# Altium footprint library MOLEX SMD.PcbLib: 54 footprints (part 2 of 4) (continued)
## MOLEX_55909-0274 [mm] "0.40mm Pitch SlimStack Dual Row 20 Circuits Surface Mount Vertical Plug" (continued)
Mechanical 14:
  drawing of 173 lines, arcs and shapes, not listed
Mechanical 15:
  lines w0.05: -3.25,-1.415 -2.16,-1.415 -2.16,-2.015 0,-2.015 2.16,-2.015 2.16,-1.415 3.25,-1.415 3.25,1.415 2.16,1.415 2.16,2.015 0,2.015 -2.16,2.015 -2.16,1.415 -3.25,1.415 -3.25,-1.415
3D body "MOLEX_55909-0274.stp": height 1.14, standoff 0, extent -3,-1.565 3,1.565

## MOLEX_55909-0474 [mm] "0.40mm Pitch SlimStack Dual Row 40 Circuits Surface Mount Vertical Plug"
height 1.14
pads (44):
  rect 0.22x0.9 smd: 1(-3.8,-1.315) 2(-3.8,1.315) 3(-3.4,-1.315) 4(-3.4,1.315) 5(-3,-1.315) 6(-3,1.315) 7(-2.6,-1.315) 8(-2.6,1.315) 9(-2.2,-1.315) 10(-2.2,1.315) 11(-1.8,-1.315) 12(-1.8,1.315) 13(-1.4,-1.315) 14(-1.4,1.315) 15(-1,-1.315) 16(-1,1.315) 17(-0.6,-1.315) 18(-0.6,1.315) 19(-0.2,-1.315) 20(-0.2,1.315) 21(0.2,-1.315) 22(0.2,1.315) 23(0.6,-1.315) 24(0.6,1.315) 25(1,-1.315) 26(1,1.315) 27(1.4,-1.315) 28(1.4,1.315) 29(1.8,-1.315) 30(1.8,1.315) 31(2.2,-1.315) 32(2.2,1.315) 33(2.6,-1.315) 34(2.6,1.315) 35(3,-1.315) 36(3,1.315) 37(3.4,-1.315) 38(3.4,1.315) 39(3.8,-1.315) 40(3.8,1.315)
  rect 0.5x0.85 smd: MECH(-4.6,-0.74) MECH(-4.6,0.74) MECH(4.6,-0.74) MECH(4.6,0.74)
Top Overlay:
  circle w0.25: c-3.75,-2.25 r0.125
  lines w0.2: -4.05,-0.565 4.05,-0.565 ; -4.05,0.565 4.05,0.565
Mechanical 8:
  drawing of 268 lines, arcs and shapes, not listed
Mechanical 14:
  drawing of 333 lines, arcs and shapes, not listed
Mechanical 15:
  lines w0.05: -5.25,-1.415 -4.16,-1.415 -4.16,-2.015 4.16,-2.015 4.16,-1.415 5.25,-1.415 5.25,1.415 4.16,1.415 4.16,2.015 -4.16,2.015 -4.16,1.415 -5.25,1.415 -5.25,-1.415
3D body "MOLEX_55909-0474.stp": height 1.14, standoff 0, extent -5,-1.565 5,1.565

## MOLEX_67800-5005 [mm] "1.27mm Pitch, 7 Contacts, Serial ATA High Speed Header, Straight with Locking Latch"
height 8.4
pads (9):
  rect 0.9x2.4 smd: 1(-3.81,0) 2(-2.54,0) 3(-1.27,0) 4(0,0) 5(1.27,0) 6(2.54,0) 7(3.81,0)
  round 2.1 hole 1.4: MECH1(-6.27,1.1) MECH2(6.56,0.1)
Top Overlay:
  circle w0.25: c-3.75,-2.75 r0.125
  lines w0.2: -7.495,1.778 -7.495,2.225 cw(c-7.045,2.225) -7.045,2.675 -6.635,2.675 -6.635,3.575 7.805,3.575 7.805,0.74 ; -6.495,-0.282 -6.495,-0.775 -5.655,-0.775 -5.655,-1.475 -4.61,-1.475 ; -4.645,0.275 -4.645,1.505 ; -4.11,1.55 -4.11,2.375 -3.51,2.375 -3.51,1.55 ; -2.85,1.55 -2.85,2.375 -2.25,2.375 -2.25,1.55 ; -1.58,1.55 -1.58,2.375 -0.98,2.375 -0.98,1.55 ; -0.31,1.55 -0.31,2.375 0.29,2.375 0.29,1.55 ; 0.96,1.55 0.96,2.375 1.56,2.375 1.56,1.55 ; 2.23,1.55 2.23,2.375 2.83,2.375 2.83,1.55 ; 3.5,1.55 3.5,2.375 4.1,2.375 4.1,1.55 ; 4.61,-1.475 5.605,-1.475 5.605,-0.924 ; 4.61,0.275 5.171,0.275 ; 4.615,1.505 4.615,2.525 5.765,2.525 5.765,1.252 ; -8.285,-0.625 -7.075,-0.625 -7.075,-1.375 -6.295,-1.375 -6.295,-2.125 6.235,-2.125 6.235,-1.325 8.615,-1.325 8.615,4.325 -7.095,4.325 -7.095,3.375 -8.285,3.375 -8.285,-0.625
Mechanical 8:
  circle w0.05: c-6.27,1.1 r0.7
  circle w0.05: c6.56,0.1 r0.7
  lines w0.05: -6.77,1.1 -6.27,1.1 ; -6.27,0.6 -6.27,1.1 ; -6.27,1.6 -6.27,1.1 ; -5.77,1.1 -6.27,1.1 ; -4.31,0 -3.81,0 ; -3.81,-0.5 -3.81,0 ; -3.81,0.5 -3.81,0 ; -3.31,0 -3.81,0 ; -3.04,0 -2.54,0 ; -2.54,-0.5 -2.54,0 ; -2.54,0.5 -2.54,0 ; -2.04,0 -2.54,0 ; -1.77,0 -1.27,0 ; -1.27,-0.5 -1.27,0 ; -1.27,0.5 -1.27,0 ; -0.77,0 -1.27,0 ; -0.5,0 0,0 ; 0,-0.5 0,0 ; 0,0.5 0,0 ; 0.5,0 0,0 ; 0.77,0 1.27,0 ; 1.27,-0.5 1.27,0 ; 1.27,0.5 1.27,0 ; 1.77,0 1.27,0 ; 2.04,0 2.54,0 ; 2.54,-0.5 2.54,0 ; 2.54,0.5 2.54,0 ; 3.04,0 2.54,0 ; 3.31,0 3.81,0 ; 3.81,-0.5 3.81,0 ; 3.81,0.5 3.81,0 ; 4.31,0 3.81,0 ; 6.06,0.1 6.56,0.1 ; 6.56,-0.4 6.56,0.1 ; 6.56,0.6 6.56,0.1 ; 7.06,0.1 6.56,0.1 ; -4.26,-1.2 -4.26,1.2 -3.36,1.2 -3.36,-1.2 -4.26,-1.2 ; -2.99,-1.2 -2.99,1.2 -2.09,1.2 -2.09,-1.2 -2.99,-1.2 ; -1.72,-1.2 -1.72,1.2 -0.82,1.2 -0.82,-1.2 -1.72,-1.2 ; -0.45,-1.2 -0.45,1.2 0.45,1.2 0.45,-1.2 -0.45,-1.2 ; 0.82,-1.2 0.82,1.2 1.72,1.2 1.72,-1.2 0.82,-1.2 ; 2.09,-1.2 2.09,1.2 2.99,1.2 2.99,-1.2 2.09,-1.2 ; 3.36,-1.2 3.36,1.2 4.26,1.2 4.26,-1.2 3.36,-1.2
Mechanical 14:
  circle w0.1: c6.545,0.1 r0.55
  circle w0.1: c-6.285,1.1 r0.55
  lines w0.1: -4.11,1.505 -4.11,2.375 -3.51,2.375 -3.51,1.505 ; -2.85,1.505 -2.85,2.375 -2.25,2.375 -2.25,1.505 ; -1.58,1.505 -1.58,2.375 -0.98,2.375 -0.98,1.505 ; -1.315,0.275 -1.315,-0.625 1.005,-0.625 1.005,0.275 ; -0.31,1.505 -0.31,2.375 0.29,2.375 0.29,1.505 ; 0.96,1.505 0.96,2.375 1.56,2.375 1.56,1.505 ; 2.23,1.505 2.23,2.375 2.83,2.375 2.83,1.505 ; 3.5,1.505 3.5,2.375 4.1,2.375 4.1,1.505 ; -8.285,-0.625 -7.075,-0.625 -7.075,-1.375 -6.295,-1.375 -6.295,-2.125 6.235,-2.125 6.235,-1.325 8.615,-1.325 8.615,4.325 -7.095,4.325 -7.095,3.375 -8.285,3.375 -8.285,-0.625 ; -7.495,0.525 ccw(c-7.045,0.525) -7.045,0.075 -6.495,0.075 -6.495,-0.775 -5.655,-0.775 -5.655,-1.475 5.605,-1.475 5.605,-0.775 7.805,-0.775 7.805,3.575 -6.635,3.575 -6.635,2.675 -7.045,2.675 ccw(c-7.045,2.225) -7.495,2.225 -7.495,0.525 ; -4.645,0.275 -4.645,1.505 4.615,1.505 4.615,2.525 5.765,2.525 5.765,0.275 -4.645,0.275
3D body "MOLEX_67800-5005.stp": height 8.4, standoff -2.65, extent -8.285,-2.125 8.615,4.325

## MOLEX_71436-1164 [mm] "1mm Centerline, FH (IEEE 1386) Surface Mount, Stacking Board-to-Board Male Connectors"
height 7.48
pads (66):
  rect 0.6x2.7 smd: 1(-15.5,1.65) 2(-15.5,-1.65) 3(-14.5,1.65) 4(-14.5,-1.65) 5(-13.5,1.65) 6(-13.5,-1.65) 7(-12.5,1.65) 8(-12.5,-1.65) 9(-11.5,1.65) 10(-11.5,-1.65) 11(-10.5,1.65) 12(-10.5,-1.65) 13(-9.5,1.65) 14(-9.5,-1.65) 15(-8.5,1.65) 16(-8.5,-1.65) 17(-7.5,1.65) 18(-7.5,-1.65) 19(-6.5,1.65) 20(-6.5,-1.65) 21(-5.5,1.65) 22(-5.5,-1.65) 23(-4.5,1.65) 24(-4.5,-1.65) 25(-3.5,1.65) 26(-3.5,-1.65) 27(-2.5,1.65) 28(-2.5,-1.65) 29(-1.5,1.65) 30(-1.5,-1.65) 31(-0.5,1.65) 32(-0.5,-1.65) 33(0.5,1.65) 34(0.5,-1.65) 35(1.5,1.65) 36(1.5,-1.65) 37(2.5,1.65) 38(2.5,-1.65) 39(3.5,1.65) 40(3.5,-1.65) 41(4.5,1.65) 42(4.5,-1.65) 43(5.5,1.65) 44(5.5,-1.65) 45(6.5,1.65) 46(6.5,-1.65) 47(7.5,1.65) 48(7.5,-1.65) 49(8.5,1.65) 50(8.5,-1.65) 51(9.5,1.65) 52(9.5,-1.65) 53(10.5,1.65) 54(10.5,-1.65) 55(11.5,1.65) 56(11.5,-1.65) 57(12.5,1.65) 58(12.5,-1.65) 59(13.5,1.65) 60(13.5,-1.65) 61(14.5,1.65) 62(14.5,-1.65) 63(15.5,1.65) 64(15.5,-1.65)
  round 0.5 hole 1.5 unplated mask+0.5: 65(-17.2,0) 66(17.2,0)
Top Overlay:
  circle w0.25: c-15.5,3.6 r0.125
  lines w0.2: -17.95,-1.275 ccw(c-16.95,-1.275) -16.95,-2.275 ; -17.95,-1 -17.95,-3.025 -16.95,-3.025 -16.95,-2.275 ; -17.95,1 -17.95,3.025 -16.95,3.025 -16.95,2.275 ; -17.95,1.275 cw(c-16.95,1.275) -16.95,2.275 ; -17.29,-1 -17.29,-1.2 ccw(c-16.84,-1.2) -16.84,-1.65 -16.3,-1.65 -16.3,-2 -16,-2 ; -17.29,1 -17.29,1.2 cw(c-16.84,1.2) -16.84,1.65 -16.3,1.65 -16.3,2 -16,2 ; -16.15,-0.5 -16.15,0.5 ; -16.15,0 16.15,0 ; -16,-2.575 -16.75,-2.575 -16.75,-2.275 -16.95,-2.275 ; -16,2.575 -16.75,2.575 -16.75,2.275 -16.95,2.275 ; 16,-2.575 16.75,-2.575 16.75,-2.275 16.95,-2.275 ; 16,-2 16.3,-2 16.3,-1.65 16.84,-1.65 ccw(c16.84,-1.2) 17.29,-1.2 17.29,-1 ; 16,2 16.3,2 16.3,1.65 16.84,1.65 cw(c16.84,1.2) 17.29,1.2 17.29,1 ; 16,2.575 16.75,2.575 16.75,2.275 16.95,2.275 ; 16.15,-0.5 16.15,0.5 ; 17.95,-1.275 cw(c16.95,-1.275) 16.95,-2.275 ; 17.95,-1 17.95,-3.025 16.95,-3.025 16.95,-2.275 ; 17.95,1 17.95,3.025 16.95,3.025 16.95,2.275 ; 17.95,1.275 ccw(c16.95,1.275) 16.95,2.275
Mechanical 14:
  drawing of 251 lines, arcs and shapes, not listed
Mechanical 15:
  lines w0.05: -18.2,-3.275 -18.2,3.275 18.2,3.275 18.2,-3.275 -18.2,-3.275
3D body "MOLEX_71436-1164.stp": height 7.35, standoff -0.75, extent -17.95,-3.025 17.95,3.075

## MOLEX_71436-2164 [mm] "1mm Centerline, FH (IEEE 1386) Surface Mount, Stacking Board-to-Board Male Connectors"
height 8.48
pads (66):
  rect 0.6x2.3 smd: 1(-15.5,1.85) 2(-15.5,-1.85) 3(-14.5,1.85) 4(-14.5,-1.85) 5(-13.5,1.85) 6(-13.5,-1.85) 7(-12.5,1.85) 8(-12.5,-1.85) 9(-11.5,1.85) 10(-11.5,-1.85) 11(-10.5,1.85) 12(-10.5,-1.85) 13(-9.5,1.85) 14(-9.5,-1.85) 15(-8.5,1.85) 16(-8.5,-1.85) 17(-7.5,1.85) 18(-7.5,-1.85) 19(-6.5,1.85) 20(-6.5,-1.85) 21(-5.5,1.85) 22(-5.5,-1.85) 23(-4.5,1.85) 24(-4.5,-1.85) 25(-3.5,1.85) 26(-3.5,-1.85) 27(-2.5,1.85) 28(-2.5,-1.85) 29(-1.5,1.85) 30(-1.5,-1.85) 31(-0.5,1.85) 32(-0.5,-1.85) 33(0.5,1.85) 34(0.5,-1.85) 35(1.5,1.85) 36(1.5,-1.85) 37(2.5,1.85) 38(2.5,-1.85) 39(3.5,1.85) 40(3.5,-1.85) 41(4.5,1.85) 42(4.5,-1.85) 43(5.5,1.85) 44(5.5,-1.85) 45(6.5,1.85) 46(6.5,-1.85) 47(7.5,1.85) 48(7.5,-1.85) 49(8.5,1.85) 50(8.5,-1.85) 51(9.5,1.85) 52(9.5,-1.85) 53(10.5,1.85) 54(10.5,-1.85) 55(11.5,1.85) 56(11.5,-1.85) 57(12.5,1.85) 58(12.5,-1.85) 59(13.5,1.85) 60(13.5,-1.85) 61(14.5,1.85) 62(14.5,-1.85) 63(15.5,1.85) 64(15.5,-1.85)
  round 0.5 hole 1.5 unplated mask+0.5: 65(-17.2,0) 66(17.2,0)
Top Overlay:
  circle w0.25: c-15.5,3.6 r0.125
  lines w0.2: -17.95,-1.275 ccw(c-16.95,-1.275) -16.95,-2.275 ; -17.95,-1 -17.95,-3.025 -16.95,-3.025 -16.95,-2.275 ; -17.95,1 -17.95,3.025 -16.95,3.025 -16.95,2.275 ; -17.95,1.275 cw(c-16.95,1.275) -16.95,2.275 ; -17.29,-1 -17.29,-1.2 ccw(c-16.84,-1.2) -16.84,-1.65 -16.3,-1.65 -16.3,-2 -16,-2 ; -17.29,1 -17.29,1.2 cw(c-16.84,1.2) -16.84,1.65 -16.3,1.65 -16.3,2 -16,2 ; -16.15,-0.5 -16.15,0.5 ; -16.15,0 16.15,0 ; -16,-2.575 -16.75,-2.575 -16.75,-2.275 -16.95,-2.275 ; -16,2.575 -16.75,2.575 -16.75,2.275 -16.95,2.275 ; 16,-2.575 16.75,-2.575 16.75,-2.275 16.95,-2.275 ; 16,-2 16.3,-2 16.3,-1.65 16.84,-1.65 ccw(c16.84,-1.2) 17.29,-1.2 17.29,-1 ; 16,2 16.3,2 16.3,1.65 16.84,1.65 cw(c16.84,1.2) 17.29,1.2 17.29,1 ; 16,2.575 16.75,2.575 16.75,2.275 16.95,2.275 ; 16.15,-0.5 16.15,0.5 ; 17.95,-1.275 cw(c16.95,-1.275) 16.95,-2.275 ; 17.95,-1 17.95,-3.025 16.95,-3.025 16.95,-2.275 ; 17.95,1 17.95,3.025 16.95,3.025 16.95,2.275 ; 17.95,1.275 ccw(c16.95,1.275) 16.95,2.275
Mechanical 8:
  drawing of 284 lines, arcs and shapes, not listed
Mechanical 14:
  drawing of 251 lines, arcs and shapes, not listed
Mechanical 15:
  lines w0.05: -18.2,-3.275 18.2,-3.275 18.2,3.275 -18.2,3.275 -18.2,-3.275
3D body "MOLEX_71436-2164.stp": height 8.35, standoff -0.75, extent -17.95,-3.05 17.95,3.05

## MOLEX_71439-2164 [mm] "2x32 Position, 1mm Centerline, Surface Mount, Stacking Board-to-Board Female Connector (IEEE 1386 Mezzanine Connector)"
height 8.48
pads (66):
  rect 0.6x2.1 smd: 1(-15.5,-1.95) 2(-15.5,1.95) 3(-14.5,-1.95) 4(-14.5,1.95) 5(-13.5,-1.95) 6(-13.5,1.95) 7(-12.5,-1.95) 8(-12.5,1.95) 9(-11.5,-1.95) 10(-11.5,1.95) 11(-10.5,-1.95) 12(-10.5,1.95) 13(-9.5,-1.95) 14(-9.5,1.95) 15(-8.5,-1.95) 16(-8.5,1.95) 17(-7.5,-1.95) 18(-7.5,1.95) 19(-6.5,-1.95) 20(-6.5,1.95) 21(-5.5,-1.95) 22(-5.5,1.95) 23(-4.5,-1.95) 24(-4.5,1.95) 25(-3.5,-1.95) 26(-3.5,1.95) 27(-2.5,-1.95) 28(-2.5,1.95) 29(-1.5,-1.95) 30(-1.5,1.95) 31(-0.5,-1.95) 32(-0.5,1.95) 33(0.5,-1.95) 34(0.5,1.95) 35(1.5,-1.95) 36(1.5,1.95) 37(2.5,-1.95) 38(2.5,1.95) 39(3.5,-1.95) 40(3.5,1.95) 41(4.5,-1.95) 42(4.5,1.95) 43(5.5,-1.95) 44(5.5,1.95) 45(6.5,-1.95) 46(6.5,1.95) 47(7.5,-1.95) 48(7.5,1.95) 49(8.5,-1.95) 50(8.5,1.95) 51(9.5,-1.95) 52(9.5,1.95) 53(10.5,-1.95) 54(10.5,1.95) 55(11.5,-1.95) 56(11.5,1.95) 57(12.5,-1.95) 58(12.5,1.95) 59(13.5,-1.95) 60(13.5,1.95) 61(14.5,-1.95) 62(14.5,1.95) 63(15.5,-1.95) 64(15.5,1.95)
  round 0.5 hole 1.5 unplated mask+0.5: 65(-17.2,0) 66(17.2,0)
Top Overlay:
  circle w0.25: c-15.5,-3.6 r0.125
  lines w0.2: -17.95,-0.6 -17.95,-3.025 -16.2,-3.025 -16.2,-1.46 -16.56,-1.46 cw(c-16.56,-0.91) -17.11,-0.91 ; -17.95,0.6 -17.95,3.025 -16.2,3.025 -16.2,1.46 -16.56,1.46 ccw(c-16.56,0.91) -17.11,0.91 ; -16.6,-0.69 -16.1,-0.69 ; -16.6,0.69 -16.1,0.69 ; -16.4,-0.69 -16.4,-0.345 ; -16.4,-0.396 -16.1,-0.396 ; -16.4,0.345 -16.4,0.69 ; -16.4,0.396 -16.1,0.396 ; 16.1,-0.69 16.6,-0.69 ; 16.1,-0.396 16.4,-0.396 ; 16.1,0.396 16.4,0.396 ; 16.1,0.69 16.6,0.69 ; 16.4,-0.69 16.4,-0.345 ; 16.4,0.345 16.4,0.69 ; 17.11,-0.91 cw(c16.56,-0.91) 16.56,-1.46 16.2,-1.46 16.2,-3.025 17.95,-3.025 17.95,-0.6 ; 17.11,0.91 ccw(c16.56,0.91) 16.56,1.46 16.2,1.46 16.2,3.025 17.95,3.025 17.95,0.6
Mechanical 8:
  lines w0.1: -1,0 0,0 0,-1
Mechanical 14:
  drawing of 608 lines, arcs and shapes, not listed
Mechanical 15:
  lines w0.05: -18.2,-3.275 18.2,-3.275 18.2,3.275 -18.2,3.275 -18.2,-3.275
3D body "MOLEX_71439-2164.stp": height 10.31, standoff -0.79, extent -17.95,-3.05 17.95,3.05

## MOLEX_71439-3164 [mm] "2x32 Position, 1mm Centerline, Surface Mount, Stacking Board-to-Board Female Connector (IEEE 1386 Mezzanine Connector)"
height 10.48
pads (66):
  rect 0.6x2.4 smd: 1(-15.5,-1.8) 2(-15.5,1.8) 3(-14.5,-1.8) 4(-14.5,1.8) 5(-13.5,-1.8) 6(-13.5,1.8) 7(-12.5,-1.8) 8(-12.5,1.8) 9(-11.5,-1.8) 10(-11.5,1.8) 11(-10.5,-1.8) 12(-10.5,1.8) 13(-9.5,-1.8) 14(-9.5,1.8) 15(-8.5,-1.8) 16(-8.5,1.8) 17(-7.5,-1.8) 18(-7.5,1.8) 19(-6.5,-1.8) 20(-6.5,1.8) 21(-5.5,-1.8) 22(-5.5,1.8) 23(-4.5,-1.8) 24(-4.5,1.8) 25(-3.5,-1.8) 26(-3.5,1.8) 27(-2.5,-1.8) 28(-2.5,1.8) 29(-1.5,-1.8) 30(-1.5,1.8) 31(-0.5,-1.8) 32(-0.5,1.8) 33(0.5,-1.8) 34(0.5,1.8) 35(1.5,-1.8) 36(1.5,1.8) 37(2.5,-1.8) 38(2.5,1.8) 39(3.5,-1.8) 40(3.5,1.8) 41(4.5,-1.8) 42(4.5,1.8) 43(5.5,-1.8) 44(5.5,1.8) 45(6.5,-1.8) 46(6.5,1.8) 47(7.5,-1.8) 48(7.5,1.8) 49(8.5,-1.8) 50(8.5,1.8) 51(9.5,-1.8) 52(9.5,1.8) 53(10.5,-1.8) 54(10.5,1.8) 55(11.5,-1.8) 56(11.5,1.8) 57(12.5,-1.8) 58(12.5,1.8) 59(13.5,-1.8) 60(13.5,1.8) 61(14.5,-1.8) 62(14.5,1.8) 63(15.5,-1.8) 64(15.5,1.8)
  round 0.5 hole 1.5 unplated mask+0.5: 65(-17.2,0) 66(17.2,0)
Top Overlay:
  circle w0.25: c-15.5,-3.6 r0.125
  lines w0.2: -17.95,-0.6 -17.95,-3.025 -16.2,-3.025 -16.2,-1.46 -16.56,-1.46 cw(c-16.56,-0.91) -17.11,-0.91 ; -17.95,0.6 -17.95,3.025 -16.2,3.025 -16.2,1.46 -16.56,1.46 ccw(c-16.56,0.91) -17.11,0.91 ; -16.6,-0.69 -16.1,-0.69 ; -16.6,0.69 -16.1,0.69 ; -16.4,-0.69 -16.4,-0.345 ; -16.4,-0.396 -16.1,-0.396 ; -16.4,0.345 -16.4,0.69 ; -16.4,0.396 -16.1,0.396 ; 16.1,-0.69 16.6,-0.69 ; 16.1,-0.396 16.4,-0.396 ; 16.1,0.396 16.4,0.396 ; 16.1,0.69 16.6,0.69 ; 16.4,-0.69 16.4,-0.345 ; 16.4,0.345 16.4,0.69 ; 17.11,-0.91 cw(c16.56,-0.91) 16.56,-1.46 16.2,-1.46 16.2,-3.025 17.95,-3.025 17.95,-0.6 ; 17.11,0.91 ccw(c16.56,0.91) 16.56,1.46 16.2,1.46 16.2,3.025 17.95,3.025 17.95,0.6
Mechanical 8:
  lines w0.1: -1,0 0,0 0,-1
Mechanical 14:
  drawing of 608 lines, arcs and shapes, not listed
Mechanical 15:
  lines w0.05: -18.2,-3.275 -18.2,3.275 18.2,3.275 18.2,-3.275 -18.2,-3.275
3D body "MOLEX_71439-3164.stp": height 10.31, standoff -0.79, extent -17.95,-3.025 17.95,3.075

## MOLEX_73251-2121 [mm] "50 Ohm, SMA Edge Mount PCB, With Jam Nut And Lock Washer"
height 6.35
pads (5):
  rect 4.19x1.78 smd: 1(0,0)
  rect 4.19x2.665 smd: 2(0,-3.492) 2(0,3.492)
  rect 4.19x2.665 smd far side: 2(0,-3.492) 2(0,3.492)
Top Overlay:
  lines w0.2: -13.763,2.642 -13.132,-2.642 ; -13.059,2.642 -12.428,-2.642 ; -12.355,2.642 -11.724,-2.642 ; -11.651,2.642 -11.02,-2.642 ; -10.947,2.642 -10.316,-2.642 ; -10.243,2.642 -9.612,-2.642 ; -9.557,2.642 -8.926,-2.642 ; -8.835,2.642 -8.204,-2.642 ; -8.435,-3.937 cw(c9.828,-1.208) -8.599,0 ; -8.435,3.937 ccw(c9.828,1.208) -8.599,0 ; -8.131,2.642 -7.5,-2.642 ; -7.427,2.642 -6.796,-2.642 ; -6.831,-3.937 ccw(c-26.385,-1.064) -6.65,0 ; -6.831,3.937 cw(c-26.197,1.073) -6.65,0 ; -6.723,2.642 -6.092,-2.642 ; -6.019,2.642 -5.388,-2.642 ; -5.315,2.642 -4.684,-2.642 ; -4.611,2.642 -3.98,-2.642 ; -3.211,-2.642 -14.641,-2.642 -14.641,2.642 -3.211,2.642 ; -2.445,-3.175 -3.211,-3.175 -3.211,3.175 -2.445,3.175 ; -8.599,0 -6.65,0 ; -8.599,-3.937 -8.599,3.937 -6.668,3.937 -6.668,-3.937 -8.599,-3.937 ; -6.668,-5.131 -6.668,5.131 -6.211,5.131 -6.211,-5.131 -6.668,-5.131
Mechanical 8:
  lines w0.1: -0.5,-3.492 0,-3.492 ; -0.5,0 0,0 ; -0.5,3.492 0,3.492 ; 0,-3.992 0,-3.492 ; 0,-2.993 0,-3.492 ; 0,-0.5 0,0 ; 0,0.5 0,0 ; 0,2.993 0,3.492 ; 0,3.992 0,3.492 ; 0.5,-3.492 0,-3.492 ; 0.5,0 0,0 ; 0.5,3.492 0,3.492 ; 2.485,-3.492 2.985,-3.492 ; 2.485,3.492 2.985,3.492 ; 2.985,-3.992 2.985,-3.492 ; 2.985,-2.993 2.985,-3.492 ; 2.985,2.993 2.985,3.492 ; 2.985,3.992 2.985,3.492 ; 3.485,-3.492 2.985,-3.492 ; 3.485,3.492 2.985,3.492 ; -2.095,-4.825 2.095,-4.825 2.095,-2.16 -2.095,-2.16 -2.095,-4.825 ; -2.095,-4.825 -2.095,0 -2.095,4.825 ; -2.095,4.825 2.095,4.825 2.095,2.16 -2.095,2.16 -2.095,4.825 ; -2.095,-0.89 2.095,-0.89 2.095,0.89 -2.095,0.89 -2.095,-0.89
Mechanical 14:
  lines w0.1: -13.763,2.642 -13.132,-2.642 ; -13.059,2.642 -12.428,-2.642 ; -12.355,2.642 -11.724,-2.642 ; -11.651,2.642 -11.02,-2.642 ; -10.947,2.642 -10.316,-2.642 ; -10.243,2.642 -9.612,-2.642 ; -9.557,2.642 -8.926,-2.642 ; -8.835,2.642 -8.204,-2.642 ; -8.435,-3.937 cw(c9.828,-1.208) -8.599,0 ; -8.435,3.937 ccw(c9.828,1.208) -8.599,0 ; -8.131,2.642 -7.5,-2.642 ; -7.427,2.642 -6.796,-2.642 ; -6.831,-3.937 ccw(c-26.385,-1.064) -6.65,0 ; -6.831,3.937 cw(c-26.197,1.073) -6.65,0 ; -6.723,2.642 -6.092,-2.642 ; -6.019,2.642 -5.388,-2.642 ; -5.315,2.642 -4.684,-2.642 ; -4.611,2.642 -3.98,-2.642 ; -3.211,-2.642 -14.641,-2.642 -14.641,2.642 -3.211,2.642 ; -2.195,-3.175 -2.195,3.175 ; -2.195,-0.623 1.361,-0.635 1.615,-0.381 1.615,0.362 1.361,0.635 -2.195,0.635 ; -8.599,0 -6.65,0 ; -8.599,-3.937 -8.599,3.937 -6.668,3.937 -6.668,-3.937 -8.599,-3.937 ; -6.668,-5.131 -6.668,5.131 -6.211,5.131 -6.211,-5.131 -6.668,-5.131 ; -3.211,-3.175 -3.211,3.175 1.615,3.175 1.615,2.159 -2.195,2.159 -2.195,-2.159 1.615,-2.159 1.615,-3.175 -3.211,-3.175
3D body "MOLEX_73251-2121_Part2.stp": height 5.76, standoff -4.49, extent -8.598,-5.131 -6.211,5.131
3D body "MOLEX_73251-2121_Part1.stp": height 3.81, standoff -2.54, extent -14.641,-3.175 1.615,3.175

## MOLEX_73252-0090 [mm] "50 Ohms, Precision Test Connector, 2.92mm PCB Jack, Field Replaceable, 2 Hole Flange, with 2 Screws 4.76mm, PCB Thickness 0.76-2.44mm"
height 10.92
pads (3):
  round 0.5 smd paste-0.25: 1(0,0)
  round 2.3 / inner round 2.3 / far side round 3.56 hole 1.6: 2(-3.58,0) 2(3.58,0)
Top Layer:
  circle w1.03: c0,0 r1.265
  region: -4.229,-3.032 -4.386,-2.813 -4.654,-2.344 -4.872,-1.849 -5.037,-1.335 -5.148,-0.807 -5.204,-0.27 -5.204,0.27 -5.148,0.807 -5.037,1.335 -4.872,1.849 -4.654,2.344 -4.386,2.813 -4.229,3.032 0,3.032 0,0.75 -0.098,0.744 -0.287,0.693 -0.457,0.595 -0.595,0.457 -0.693,0.287 -0.744,0.098 -0.744,-0.098 -0.693,-0.287 -0.595,-0.457 -0.457,-0.595 -0.287,-0.693 -0.098,-0.744 0,-0.75 0,-3.032
  region: 0,-3.032 4.229,-3.032 4.386,-2.813 4.654,-2.344 4.872,-1.849 5.037,-1.335 5.148,-0.807 5.204,-0.27 5.204,0.27 5.148,0.807 5.037,1.335 4.872,1.849 4.654,2.344 4.386,2.813 4.229,3.032 0,3.032 0,0.75 0.098,0.744 0.287,0.693 0.457,0.595 0.595,0.457 0.693,0.287 0.744,0.098 0.744,-0.098 0.693,-0.287 0.595,-0.457 0.457,-0.595 0.287,-0.693 0.098,-0.744 0,-0.75
Top Overlay:
  lines w0.2: -4.405,-3.382 cw(c0,0) -4.405,3.382 -0.851,3.382 cw(c0,0) 0.851,3.382 4.405,3.382 cw(c0,0) 4.405,-3.382 0.851,-3.382 cw(c0,0) -0.851,-3.382 -4.405,-3.382
Bottom Overlay:
  circle w0.2: c3.58,0 r2.13
  circle w0.2: c-3.58,0 r2.13
Mechanical 8:
  circle w0.1: c3.58,0 r1.78
  circle w0.1: c-3.58,0 r1.78
  circle w0.1: c3.58,0 r0.8
  circle w0.1: c-3.58,0 r0.8
  circle w0.1: c0,0 r1.265
  circle w0.1: c0,0 r0.25
  circle w0.1: c0,0 r1.78
  lines w0.1: -4.08,0 -3.58,0 ; -3.58,-0.5 -3.58,0 ; -3.58,0.5 -3.58,0 ; -3.08,0 -3.58,0 ; -1.619,-0.354 -1.265,0 ; -1.619,0.354 -1.265,0 ; -1.394,-0.894 -0.894,-0.894 ; -1.394,0.894 -0.894,0.894 ; -0.911,-0.354 -1.265,0 ; -0.911,0.354 -1.265,0 ; -0.894,-1.394 -0.894,-0.894 ; -0.894,-0.394 -0.894,-0.894 ; -0.894,0.394 -0.894,0.894 ; -0.894,1.394 -0.894,0.894 ; -0.5,0 0,0 ; -0.394,-0.894 -0.894,-0.894 ; -0.394,0.894 -0.894,0.894 ; -0.354,-1.619 0,-1.265 ; -0.354,-0.911 0,-1.265 ; -0.354,0.911 0,1.265 ; -0.354,1.619 0,1.265 ; 0,-0.5 0,0 ; 0,0.5 0,0 ; 0.354,-1.619 0,-1.265 ; 0.354,-0.911 0,-1.265 ; 0.354,0.911 0,1.265 ; 0.354,1.619 0,1.265 ; 0.394,-0.894 0.894,-0.894 ; 0.394,0.894 0.894,0.894 ; 0.5,0 0,0 ; 0.894,-1.394 0.894,-0.894 ; 0.894,-0.394 0.894,-0.894 ; 0.894,0.394 0.894,0.894 ; 0.894,1.394 0.894,0.894 ; 0.911,-0.354 1.265,0 ; 0.911,0.354 1.265,0 ; 1.394,-0.894 0.894,-0.894 ; 1.394,0.894 0.894,0.894 ; 1.619,-0.354 1.265,0 ; 1.619,0.354 1.265,0 ; 3.08,0 3.58,0 ; 3.58,-0.5 3.58,0 ; 3.58,0.5 3.58,0 ; 4.08,0 3.58,0 ; 0,-3.032 -4.229,-3.032 cw(c0,0) -4.229,3.032 0,3.032 ; 0,-3.032 0,-0.75 ; 0,-3.032 4.229,-3.032 ccw(c0,0) 4.229,3.032 0,3.032 ; 0,-0.75 ccw(c0,0) 0,0.75 ; 0,-0.75 cw(c0,0) 0,0.75 ; 0,0.75 0,3.032
Mechanical 14:
  circle w0.1: c0,0 r1.46
  circle w0.1: c0,0 r2.312
  circle w0.1: c0,0 r2.414
  circle w0.1: c0,0 r2.68
  circle w0.1: c0,0 r3.137
  lines w0.1: -3.111,-0.407 cw(c-3.581,0) -3.111,0.406 ; -3.071,-0.645 cw(c-3.58,0) -3.071,0.645 ; -3.071,-0.644 cw(c-3.581,0) -3.071,0.644 ; -1.35,-2.832 -4.125,-2.832 cw(c0,0) -4.125,2.832 -1.35,2.832 ; 1.35,-2.832 4.125,-2.832 ccw(c0,0) 4.125,2.832 1.35,2.832 ; 3.07,-0.647 ccw(c3.58,0) 3.07,0.647 ; 3.111,-0.407 ccw(c3.581,0) 3.111,0.406 ; -0.102,-0.627 cw(c0,0) -0.102,0.627 -0.102,0.472 ccw(c0,0) -0.102,-0.472 -0.102,-0.627 ; 0.102,-0.627 ccw(c0,0) 0.102,0.627 0.102,0.472 cw(c0,0) 0.102,-0.472 0.102,-0.627
3D body "MOLEX_73252-0090_Part2.stp": height 3.18, standoff -2.67, extent -5.053,-1.473 5.053,1.473
3D body "MOLEX_73252-0090_Part1.stp": height 10.92, standoff 0, extent -5.004,-3.136 5.004,3.136

## MOLEX_73413-0040 [mm] "50 Ohms, Magnetic Vertical SSMCX Jack"
height 3.35
pads (5):
  round 1.1 smd: 1(0,0)
  rect 0.78x0.78 smd: 2(-1.01,-1.01) 2(-1.01,1.01) 2(1.01,-1.01) 2(1.01,1.01)
Top Overlay:
  lines w0.2: -1.275,-0.27 -1.275,0.27 ; -0.869,-0.27 cw(c0,0) -0.869,0.27 ; -0.27,-1.275 0.27,-1.275 ; -0.27,-0.869 ccw(c0,0) 0.27,-0.869 ; -0.27,0.869 cw(c0,0) 0.27,0.869 ; -0.27,1.275 0.27,1.275 ; 0.869,-0.27 ccw(c0,0) 0.869,0.27 ; 1.275,-0.27 1.275,0.27
Mechanical 8:
  circle w0.1: c0,0 r0.55
  lines w0.1: -1.51,-1.01 -1.01,-1.01 ; -1.51,1.01 -1.01,1.01 ; -1.01,-1.51 -1.01,-1.01 ; -1.01,-0.51 -1.01,-1.01 ; -1.01,0.51 -1.01,1.01 ; -1.01,1.51 -1.01,1.01 ; -0.51,-1.01 -1.01,-1.01 ; -0.51,1.01 -1.01,1.01 ; -0.5,0 0,0 ; 0,-0.5 0,0 ; 0,0.5 0,0 ; 0.5,0 0,0 ; 0.51,-1.01 1.01,-1.01 ; 0.51,1.01 1.01,1.01 ; 1.01,-1.51 1.01,-1.01 ; 1.01,-0.51 1.01,-1.01 ; 1.01,0.51 1.01,1.01 ; 1.01,1.51 1.01,1.01 ; 1.51,-1.01 1.01,-1.01 ; 1.51,1.01 1.01,1.01 ; -1.4,-1.4 -1.4,-0.62 -0.62,-0.62 -0.62,-1.4 -1.4,-1.4 ; -1.4,0.62 -1.4,1.4 -0.62,1.4 -0.62,0.62 -1.4,0.62 ; 0.62,-1.4 0.62,-0.62 1.4,-0.62 1.4,-1.4 0.62,-1.4 ; 0.62,0.62 0.62,1.4 1.4,1.4 1.4,0.62 0.62,0.62
Mechanical 14:
  circle w0.1: c0,0 r0.91
  circle w0.1: c0,0 r1.12
  circle w0.1: c0,0 r1.25
  lines w0.1: -1.275,-1.275 -1.275,1.275 1.275,1.275 1.275,-1.275 -1.275,-1.275 ; -0.316,-0.008 ccw(c0,0.067) 0.316,-0.009 0.217,-0.008 cw(c0,0.064) -0.217,-0.008 -0.316,-0.008 ; -0.316,0.008 cw(c0,-0.067) 0.316,0.008 0.217,0.008 ccw(c0,-0.064) -0.217,0.008 -0.316,0.008
Mechanical 15:
  lines w0.05: -1.65,-1.65 -1.65,1.65 1.65,1.65 1.65,-1.65 -1.65,-1.65
3D body "MOLEX_73413-0040.stp": height 3.25, standoff 0, extent -1.275,-1.275 1.275,1.275

## MOLEX_73415-3320 [mm] "50 Ohm SMP Vertical Plug"
height 4.1
pads (5):
  rect 0.54x1.2 smd: 1(0,3.1)
  round 1.9 hole 1.2: 2(-2.54,-2.54) 2(-2.54,2.54) 2(2.54,-2.54) 2(2.54,2.54)
Top Layer keep-out:
  lines w0.1: -3,-1.24 -3,1.24 -2.54,1.24 ccw(c-2.54,2.54) -1.24,2.54 -1.24,3 -0.62,3 -0.62,2.15 0.62,2.15 0.62,3 1.24,3 1.24,2.54 ccw(c2.54,2.54) 2.54,1.24 3,1.24 3,-1.24 2.54,-1.24 ccw(c2.54,-2.54) 1.24,-2.54 1.24,-3 -1.24,-3 -1.24,-2.54 ccw(c-2.54,-2.54) -2.54,-1.24 -3,-1.24
Top Overlay:
  circle w0.2: c0,0 r1.5
  circle w0.2: c0,0 r0.2
  lines w0.2: -3,-1.378 -3,1.378 ; -2.709,-1.29 cw(c0,0) -2.703,1.301 ; -2.504,-1.252 cw(c0,0) -2.484,1.291 ; -1.378,-3 1.378,-3 ; -1.301,-2.703 ccw(c0,0) 1.29,-2.709 ; -1.291,-2.484 ccw(c0,0) 1.252,-2.504 ; -1.29,2.709 cw(c0,0) -0.637,2.932 ; -1.252,2.504 cw(c0,0) -0.649,2.724 ; 0.637,2.932 cw(c0,0) 1.29,2.709 ; 0.649,2.724 cw(c0,0) 1.252,2.504 ; 2.484,-1.291 ccw(c0,0) 2.504,1.252 ; 2.703,-1.301 ccw(c0,0) 2.709,1.29 ; 3,-1.378 3,1.378
Mechanical 8:
  lines w0.1: -3.04,-2.54 -2.54,-2.54 ; -3.04,2.54 -2.54,2.54 ; -2.54,-3.04 -2.54,-2.54 ; -2.54,-2.04 -2.54,-2.54 ; -2.54,2.04 -2.54,2.54 ; -2.54,3.04 -2.54,2.54 ; -2.04,-2.54 -2.54,-2.54 ; -2.04,2.54 -2.54,2.54 ; -0.5,0 0,0 ; -0.5,3.1 0,3.1 ; 0,-0.5 0,0 ; 0,0.5 0,0 ; 0,2.6 0,3.1 ; 0,3.6 0,3.1 ; 0.5,0 0,0 ; 0.5,3.1 0,3.1 ; 2.04,-2.54 2.54,-2.54 ; 2.04,2.54 2.54,2.54 ; 2.54,-3.04 2.54,-2.54 ; 2.54,-2.04 2.54,-2.54 ; 2.54,2.04 2.54,2.54 ; 2.54,3.04 2.54,2.54 ; 3.04,-2.54 2.54,-2.54 ; 3.04,2.54 2.54,2.54 ; -0.27,2.5 0.27,2.5 0.27,3.7 -0.27,3.7 -0.27,2.5
Mechanical 14:
  circle w0.1: c0,0 r3
  circle w0.1: c0,0 r2.8
  circle w0.1: c0,0 r1.5
  circle w0.1: c0,0 r0.2
  lines w0.1: -0.2,3 -0.2,3.5 0.2,3.5 0.2,3 ; -3,-2.7 -2.7,-3 2.7,-3 3,-2.7 3,2.7 2.7,3 -2.7,3 -3,2.7 -3,-2.7
3D body "MOLEX_73415-3320.stp": height 4.1, standoff -2.2, extent -3,-3 3,3.5